# Altium schematic symbol library 724452_RPL-HX_Mobile_AEP_Rev0p91_Library.SchLib: 162 symbols (part 2 of 5) (continued)
## C_RPL_HX_EXT (continued)
part L pins: AU50 VSS_242, AU54 VSS_243, AV1 VSS_248, AV5 VSS_275, AV9 VSS_279, AV10 VSS_249, AV11 VSS_250, AV12 VSS_251, AV13 VSS_252, AV14 VSS_253, AV18 VSS_254, AV20 VSS_255, AV21 VSS_256, AV23 VSS_257, AV25 VSS_258, AV27 VSS_259, AV29 VSS_260, AV31 VSS_261, AV33 VSS_262, AV35 VSS_263, AV36 VSS_264, AV40 VSS_265, AV41 VSS_266, AV42 VSS_267, AV43 VSS_268, AV44 VSS_269, AV45 VSS_270, AV46 VSS_271, AV47 VSS_272, AV48 VSS_273, AV49 VSS_274, AV50 VSS_276, AV52 VSS_277, AV54 VSS_278, AW1 VSS_280, AW3 VSS_285, AW5 VSS_292, AW7 VSS_296, AW9 VSS_297, AW14 VSS_281, AW16 VSS_282, AW18 VSS_283, AW20 VSS_284, AW33 VSS_286, AW34 VSS_287, AW36 VSS_288, AW38 VSS_289, AW40 VSS_290, AW45 VSS_291, AW50 VSS_293, AW52 VSS_294, AW54 VSS_295, AY1 VSS_298, AY3 VSS_310, AY5 VSS_322, AY7 VSS_325, AY9 VSS_326, AY11 VSS_299, AY12 VSS_300, AY14 VSS_301, AY16 VSS_302, AY18 VSS_303, AY20 VSS_304, AY22 VSS_305, AY23 VSS_306, AY24 VSS_307, AY26 VSS_308, AY28 VSS_309, AY30 VSS_311, AY32 VSS_312, AY33 VSS_313, AY36 VSS_314, AY38 VSS_315, AY40 VSS_316, AY42 VSS_317, AY43 VSS_318, AY45 VSS_319, AY47 VSS_320, AY48 VSS_321, AY50 VSS_323, AY54 VSS_324, BA1 VSS_346, BA5 VSS_354, BA9 VSS_360, BA14 VSS_347, BA18 VSS_348, BA20 VSS_349, BA35 VSS_350, BA36 VSS_351, BA40 VSS_352, BA45 VSS_353, BA50 VSS_355, BA51 VSS_356, BA52 VSS_357, BA53 VSS_358, BA54 VSS_359, BB1 VSS_361, BB2 VSS_372, BB3 VSS_383, BB4 VSS_394, BB5 VSS_405, BB6 VSS_407, BB7 VSS_408, BB8 VSS_409, BB9 VSS_410, BB10 VSS_362, BB11 VSS_363, BB12 VSS_364, BB13 VSS_365, BB14 VSS_366, BB15 VSS_367, BB16 VSS_368, BB17 VSS_369, BB18 VSS_370, BB19 VSS_371, BB20 VSS_373, BB21 VSS_374, BB22 VSS_375, BB23 VSS_376, BB24 VSS_377
part M pins: AL46 VSS_122, AL48 VSS_123, AL50 VSS_124, AL51 VSS_125, AL52 VSS_126, AL53 VSS_127, AL54 VSS_128, AM1 VSS_133, AM2 VSS_134, AM3 VSS_135, AM4 VSS_136, AM5 VSS_139, AM6 VSS_142, AM7 VSS_143, AM8 VSS_144, AM9 VSS_145, AM46 VSS_137, AM48 VSS_138, AM50 VSS_140, AM54 VSS_141, AN1 VSS_146, AN5 VSS_152, AN9 VSS_156, AN11 VSS_147, AN25 VSS_148, AN28 VSS_149, AN41 VSS_150, AN46 VSS_151, AN50 VSS_153, AN52 VSS_154, AN54 VSS_155, AP1 VSS_157, AP3 VSS_160, AP5 VSS_167, AP7 VSS_171, AP9 VSS_172, AP25 VSS_158, AP28 VSS_159, AP41 VSS_161, AP45 VSS_162, AP46 VSS_163, AP47 VSS_164, AP48 VSS_165, AP49 VSS_166, AP50 VSS_168, AP52 VSS_169, AP54 VSS_170, AR1 VSS_173, AR3 VSS_185, AR5 VSS_196, AR7 VSS_199, AR9 VSS_200, AR11 VSS_174, AR13 VSS_175, AR15 VSS_176, AR17 VSS_177, AR22 VSS_178, AR23 VSS_179, AR24 VSS_180, AR25 VSS_181, AR26 VSS_182, AR28 VSS_183, AR29 VSS_184, AR30 VSS_186, AR31 VSS_187, AR32 VSS_188, AR33 VSS_189, AR34 VSS_190, AR36 VSS_191, AR38 VSS_192, AR41 VSS_193, AR43 VSS_194, AR45 VSS_195, AR50 VSS_197, AR54 VSS_198, AT1 VSS_201, AT5 VSS_214, AT9 VSS_220, AT18 VSS_202, AT19 VSS_203, AT20 VSS_204, AT21 VSS_205, AT24 VSS_206, AT32 VSS_207, AT35 VSS_208, AT36 VSS_209, AT41 VSS_210, AT45 VSS_211, AT47 VSS_212, AT48 VSS_213, AT50 VSS_215, AT51 VSS_216, AT52 VSS_217, AT53 VSS_218, AT54 VSS_219, AU1 VSS_221, AU2 VSS_227, AU3 VSS_231, AU4 VSS_239, AU5 VSS_241, AU6 VSS_244, AU7 VSS_245, AU8 VSS_246, AU9 VSS_247, AU14 VSS_222, AU15 VSS_223, AU16 VSS_224, AU17 VSS_225, AU18 VSS_226, AU21 VSS_228, AU23 VSS_229, AU26 VSS_230, AU30 VSS_232, AU33 VSS_233, AU35 VSS_234, AU36 VSS_235, AU37 VSS_236, AU38 VSS_237, AU39 VSS_238, AU45 VSS_240
part N pins: AA1 VSS_34, AA2 VSS_36, AA3 VSS_37, AA4 VSS_38, AA7 VSS_39, AA9 VSS_40, AA11 VSS_35, AB3 VSS_43, AB4 VSS_44, AB5 VSS_45, AB6 VSS_46, AB7 VSS_47, AB8 VSS_48, AB9 VSS_49, AB10 VSS_41, AB11 VSS_42, AC1 VSS_50, AC2 VSS_55, AC5 VSS_59, AC8 VSS_62, AC9 VSS_63, AC10 VSS_51, AC11 VSS_52, AC12 VSS_53, AC13 VSS_54, AC45 VSS_56, AC47 VSS_57, AC49 VSS_58, AC51 VSS_60, AC53 VSS_61, AD3 VSS_64, AD4 VSS_65, AD6 VSS_66, AD9 VSS_67, AE1 VSS_68, AE2 VSS_70, AE5 VSS_74, AE8 VSS_77, AE9 VSS_78, AE11 VSS_69, AE45 VSS_71, AE47 VSS_72, AE49 VSS_73, AE51 VSS_75, AE53 VSS_76, AF3 VSS_79, AF4 VSS_80, AF6 VSS_81, AF9 VSS_82, AG1 VSS_83, AG2 VSS_85, AG5 VSS_89, AG8 VSS_92, AG9 VSS_93, AG11 VSS_84, AG45 VSS_86, AG47 VSS_87, AG49 VSS_88, AG51 VSS_90, AG53 VSS_91, AH3 VSS_94, AH4 VSS_95, AH5 VSS_96, AH6 VSS_97, AH9 VSS_98, AJ1 VSS_99, AJ2 VSS_101, AJ5 VSS_108, AJ8 VSS_111, AJ9 VSS_112, AJ11 VSS_100, AJ44 VSS_102, AJ45 VSS_103, AJ46 VSS_104, AJ47 VSS_105, AJ48 VSS_106, AJ49 VSS_107, AJ50 VSS_109, AJ51 VSS_110, AK3 VSS_113, AK4 VSS_114, AK6 VSS_117, AK9 VSS_118, AK46 VSS_115, AK50 VSS_116, AL3 VSS_120, AL4 VSS_121, AL6 VSS_129, AL7 VSS_130, AL8 VSS_131, AL9 VSS_132, AL11 VSS_119, V6 VSS_803, V7 VSS_804, V9 VSS_805, V45 VSS_797, V47 VSS_798, V49 VSS_799, V51 VSS_801, V53 VSS_802, W1 VSS_806, W2 VSS_809, W3 VSS_810, W4 VSS_811, W7 VSS_812, W8 VSS_813, W9 VSS_814, W10 VSS_807, W11 VSS_808, Y1 VSS_815, Y4 VSS_817, Y5 VSS_821, Y6 VSS_824, Y7 VSS_825, Y9 VSS_826, Y11 VSS_816, Y45 VSS_818, Y47 VSS_819, Y49 VSS_820, Y51 VSS_822, Y53 VSS_823
part O pins: K12 VSS_672, K14 VSS_673, K19 VSS_674, K22 VSS_675, K25 VSS_676, K28 VSS_677, K34 VSS_678, K36 VSS_679, K39 VSS_681, K41 VSS_683, K43 VSS_684, K45 VSS_685, K47 VSS_686, K49 VSS_687, K51 VSS_689, K53 VSS_690, L1 VSS_693, L2 VSS_696, L3 VSS_699, L4 VSS_700, L7 VSS_701, L9 VSS_702, L18 VSS_694, L19 VSS_695, L25 VSS_697, L27 VSS_698, M1 VSS_703, M4 VSS_716, M5 VSS_722, M6 VSS_725, M7 VSS_726, M8 VSS_727, M9 VSS_728, M11 VSS_704, M17 VSS_705, M18 VSS_706, M22 VSS_707, M25 VSS_708, M27 VSS_709, M29 VSS_710, M31 VSS_711, M33 VSS_712, M35 VSS_713, M37 VSS_714, M39 VSS_715, M41 VSS_717, M43 VSS_718, M45 VSS_719, M47 VSS_720, M49 VSS_721, M51 VSS_723, M53 VSS_724, N1 VSS_729, N2 VSS_735, N3 VSS_738, N4 VSS_739, N7 VSS_740, N9 VSS_741, N13 VSS_730, N14 VSS_731, N15 VSS_732, N16 VSS_733, N17 VSS_734, N25 VSS_736, N27 VSS_737, P1 VSS_742, P4 VSS_756, P5 VSS_762, P6 VSS_765, P7 VSS_766, P8 VSS_767, P9 VSS_768, P12 VSS_743, P17 VSS_744, P18 VSS_745, P19 VSS_746, P22 VSS_747, P25 VSS_748, P27 VSS_749, P29 VSS_750, P31 VSS_751, P33 VSS_752, P35 VSS_753, P37 VSS_754, P39 VSS_755, P41 VSS_757, P43 VSS_758, P45 VSS_759, P47 VSS_760, P49 VSS_761, P51 VSS_763, P53 VSS_764, R1 VSS_769, R2 VSS_772, R3 VSS_774, R4 VSS_775, R7 VSS_776, R10 VSS_770, R11 VSS_771, R27 VSS_773, T1 VSS_777, T4 VSS_778, T5 VSS_782, T6 VSS_785, T7 VSS_786, T8 VSS_787, T9 VSS_788, T45 VSS_779, T47 VSS_780, T49 VSS_781, T51 VSS_783, T53 VSS_784, U1 VSS_789, U2 VSS_790, U3 VSS_791, U4 VSS_792, U7 VSS_793, U9 VSS_794, V1 VSS_795, V4 VSS_796, V5 VSS_800
part P pins: D43 VSS_550, D45 VSS_551, D47 VSS_552, D49 VSS_553, D51 VSS_555, D53 VSS_556, E1 VSS_561, E2 VSS_567, E3 VSS_573, E4 VSS_576, E5 VSS_578, E8 VSS_579, E10 VSS_562, E12 VSS_563, E14 VSS_564, E16 VSS_565, E18 VSS_566, E20 VSS_568, E22 VSS_569, E24 VSS_570, E26 VSS_571, E28 VSS_572, E30 VSS_574, E36 VSS_575, E42 VSS_577, F1 VSS_580, F4 VSS_598, F5 VSS_603, F6 VSS_606, F7 VSS_607, F8 VSS_608, F10 VSS_581, F12 VSS_582, F14 VSS_583, F16 VSS_584, F18 VSS_585, F20 VSS_586, F22 VSS_587, F24 VSS_588, F26 VSS_589, F28 VSS_590, F30 VSS_591, F31 VSS_592, F33 VSS_593, F35 VSS_594, F36 VSS_595, F37 VSS_596, F39 VSS_597, F41 VSS_599, F45 VSS_600, F47 VSS_601, F49 VSS_602, F51 VSS_604, F53 VSS_605, G1 VSS_609, G2 VSS_620, G3 VSS_631, G4 VSS_636, G7 VSS_638, G8 VSS_639, G9 VSS_640, G10 VSS_610, G11 VSS_611, G12 VSS_612, G13 VSS_613, G14 VSS_614, G15 VSS_615, G16 VSS_616, G17 VSS_617, G18 VSS_618, G19 VSS_619, G20 VSS_621, G21 VSS_622, G22 VSS_623, G23 VSS_624, G24 VSS_625, G25 VSS_626, G26 VSS_627, G27 VSS_628, G28 VSS_629, G29 VSS_630, G30 VSS_632, G34 VSS_633, G36 VSS_634, G38 VSS_635, G40 VSS_637, H1 VSS_641, H4 VSS_646, H5 VSS_652, H6 VSS_655, H7 VSS_656, H17 VSS_642, H19 VSS_643, H25 VSS_644, H28 VSS_645, H41 VSS_647, H43 VSS_648, H45 VSS_649, H47 VSS_650, H49 VSS_651, H51 VSS_653, H53 VSS_654, J1 VSS_657, J2 VSS_660, J3 VSS_662, J4 VSS_668, J7 VSS_669, J16 VSS_658, J19 VSS_659, J25 VSS_661, J30 VSS_663, J33 VSS_664, J35 VSS_665, J37 VSS_666, K1 VSS_670, K4 VSS_682, K5 VSS_688, K6 VSS_691, K7 VSS_692, K10 VSS_671
part Q pins: AA13 RSVD_2, AB13 RSVD_4, AB44 VCCGT_1, AB45 VCCGT_2, AB46 VCCGT_3, AB47 VCCGT_4, AB48 VCCGT_5, AB49 VCCGT_6, AB50 VCCGT_7, AB51 VCCGT_8, AB52 VCCGT_9, AB53 VCCGT_10, AB54 VCCGT_11, AK1 VCC1P8_PROC_1, AN26 VDD2_1, AN27 VDD2_2, AP26 VDD2_3, AP27 VDD2_4, AR27 VDD2_5, AR42 RSVD_TP_5, AU44 RSVD_21, C43 RSVD_24, H20 VCCIN_AUX_14, H21 VCCIN_AUX_15, H22 VCCIN_AUX_16, H23 VCCIN_AUX_17, H24 VCCIN_AUX_18, J20 VCCIN_AUX_19, J21 VCCIN_AUX_20, J22 VCCIN_AUX_21, J23 VCCIN_AUX_22, J24 VCCIN_AUX_23, J32 RSVD_36, K20 VCCIN_AUX_24, K21 VCCIN_AUX_25, K23 VCCIN_AUX_26, K24 VCCIN_AUX_27, K38 RSVD_TP_14, L20 VCCIN_AUX_28, L21 VCCIN_AUX_29, L22 VCCIN_AUX_30, L23 VCCIN_AUX_31, L24 VCCIN_AUX_32, M19 VCCIN_AUX_33, R13 RSVD_51, R14 RSVD_52, R15 RSVD_53, R16 RSVD_54, R17 RSVD_55, R18 RSVD_56, T13 RSVD_58, U13 RSVD_60, V13 RSVD_62, W13 RSVD_64, Y13 RSVD_66
part R pins: A44 VCCCORE_1, A45 VCCCORE_2, A46 VCCCORE_3, A47 VCCCORE_4, A48 VCCCORE_5, A49 VCCCORE_6, A50 VCCCORE_7, A51 VCCCORE_8, A52 VCCCORE_9, A53 VCCCORE_10, A54 VCCCORE_11, B44 VCCCORE_129, B46 VCCCORE_130, B48 VCCCORE_131, B50 VCCCORE_132, B52 VCCCORE_133, B53 VCCCORE_134, B54 VCCCORE_135, C44 VCCCORE_136, C45 VCCCORE_137, C46 VCCCORE_138, C47 VCCCORE_139, C48 VCCCORE_140, C49 VCCCORE_141, C50 VCCCORE_142, C51 VCCCORE_143, C52 VCCCORE_144, C53 VCCCORE_145, C54 VCCCORE_146, D44 VCCCORE_147, D46 VCCCORE_148, D48 VCCCORE_149, D50 VCCCORE_150, D52 VCCCORE_151, D54 VCCCORE_152, E43 VCCCORE_153, E44 VCCCORE_154, E45 VCCCORE_155, E46 VCCCORE_156, E47 VCCCORE_157, E48 VCCCORE_158, E49 VCCCORE_159, E50 VCCCORE_160, E51 VCCCORE_161, E52 VCCCORE_162, E53 VCCCORE_163, E54 VCCCORE_164, F42 VCCCORE_165, F43 VCCCORE_166, F44 VCCCORE_167, F46 VCCCORE_168, F48 VCCCORE_169, F50 VCCCORE_170, F52 VCCCORE_171, F54 VCCCORE_172, G41 VCCCORE_173, G42 VCCCORE_174, G43 VCCCORE_175, G44 VCCCORE_176, G45 VCCCORE_177, G46 VCCCORE_178, G47 VCCCORE_179, G48 VCCCORE_180, G49 VCCCORE_181, G50 VCCCORE_182, G51 VCCCORE_183, G52 VCCCORE_184, G53 VCCCORE_185, G54 VCCCORE_186, H40 VCCCORE_187, H42 VCCCORE_188, H44 VCCCORE_189, H46 VCCCORE_190, H48 VCCCORE_191, H50 VCCCORE_192, H52 VCCCORE_193, H54 VCCCORE_194, J39 VCCCORE_195, J40 VCCCORE_196, J41 VCCCORE_197, J42 VCCCORE_198, J43 VCCCORE_199, J44 VCCCORE_200, J45 VCCCORE_201, J46 VCCCORE_202, J47 VCCCORE_203, J48 VCCCORE_204, J49 VCCCORE_205, J50 VCCCORE_206, J51 VCCCORE_207
part S pins: A3 VSS_21, A4 VSS_28, A5 VSS_31, A8 VSS_32, A9 VSS_33, A10 VSS_1, A11 VSS_2, A12 VSS_3, A13 VSS_4, A14 VSS_5, A15 VSS_6, A16 VSS_7, A17 VSS_8, A18 VSS_9, A19 VSS_10, A20 VSS_11, A21 VSS_12, A22 VSS_13, A23 VSS_14, A24 VSS_15, A25 VSS_16, A26 VSS_17, A27 VSS_18, A28 VSS_19, A29 VSS_20, A30 VSS_22, A32 VSS_23, A34 VSS_24, A35 VSS_25, A36 VSS_26, A38 VSS_27, A40 VSS_29, A42 VSS_30, B2 VSS_332, B3 VSS_338, B7 VSS_344, B9 VSS_345, B11 VSS_327, B13 VSS_328, B15 VSS_329, B17 VSS_330, B19 VSS_331, B21 VSS_333, B23 VSS_334, B25 VSS_335, B27 VSS_336, B29 VSS_337, B35 VSS_339, B45 VSS_340, B47 VSS_341, B49 VSS_342, B51 VSS_343, C1 VSS_503, C2 VSS_509, C3 VSS_515, C7 VSS_521, C9 VSS_522, C11 VSS_504, C13 VSS_505, C15 VSS_506, C17 VSS_507, C19 VSS_508, C21 VSS_510, C23 VSS_511, C25 VSS_512, C27 VSS_513, C29 VSS_514, C31 VSS_516, C33 VSS_517, C35 VSS_518, C37 VSS_519, C39 VSS_520, D1 VSS_523, D4 VSS_548, D5 VSS_554, D6 VSS_557, D7 VSS_558, D8 VSS_559, D9 VSS_560, D10 VSS_524, D11 VSS_525, D12 VSS_526, D13 VSS_527, D14 VSS_528, D15 VSS_529, D16 VSS_530, D17 VSS_531, D18 VSS_532, D19 VSS_533, D20 VSS_534, D21 VSS_535, D22 VSS_536, D23 VSS_537, D24 VSS_538, D25 VSS_539, D26 VSS_540, D27 VSS_541, D28 VSS_542, D29 VSS_543, D32 VSS_544, D34 VSS_545, D36 VSS_546, D38 VSS_547, D40 VSS_549
part A text: 1 OF 19
part B text: 2 OF 19
part C text: 3 OF 19
part D text: 4 OF 19
part E text: 5 OF 19
part F text: 6 OF 19
part G text: 7 OF 19
part H text: 8 OF 19
part I text: 9 OF 19
part J text: 10 OF 19
part K text: 11 OF 19
part L text: 12 OF 19
part M text: 13 OF 19
part N text: 14 OF 19
part O text: 15 OF 19
part P text: 16 OF 19
part Q text: 17 OF 19
part R text: 18 OF 19
part S text: 19 OF 19

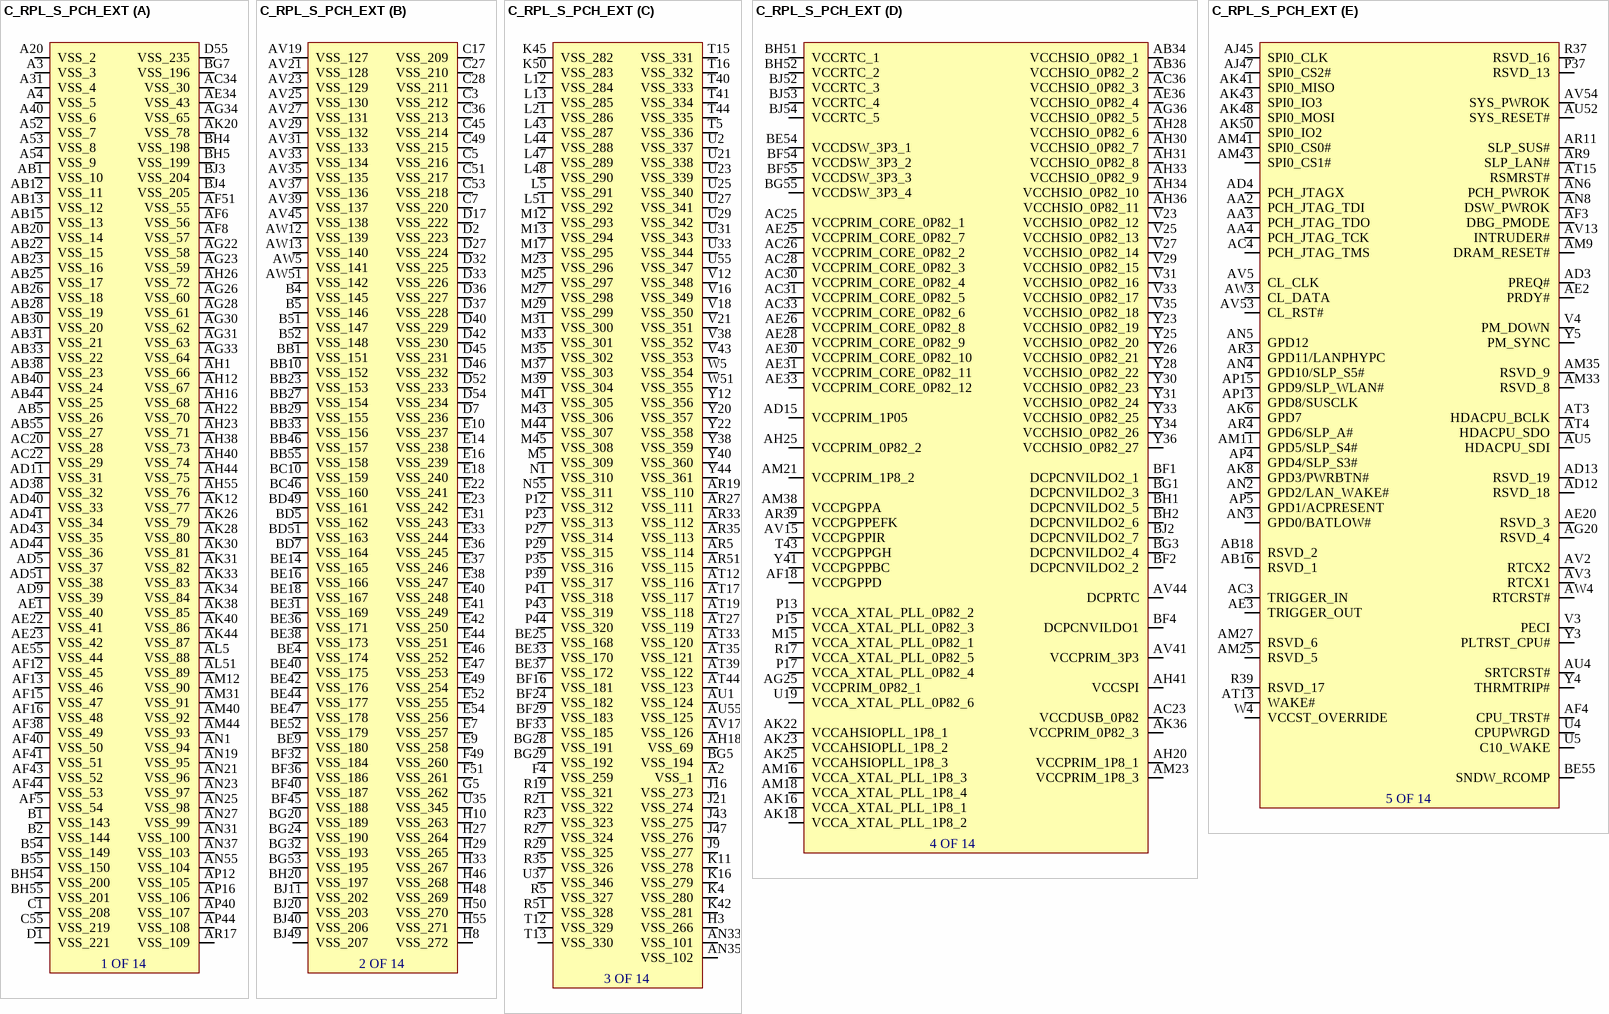
[diagram p20: symbol C_RPL_S_PCH_EXT]

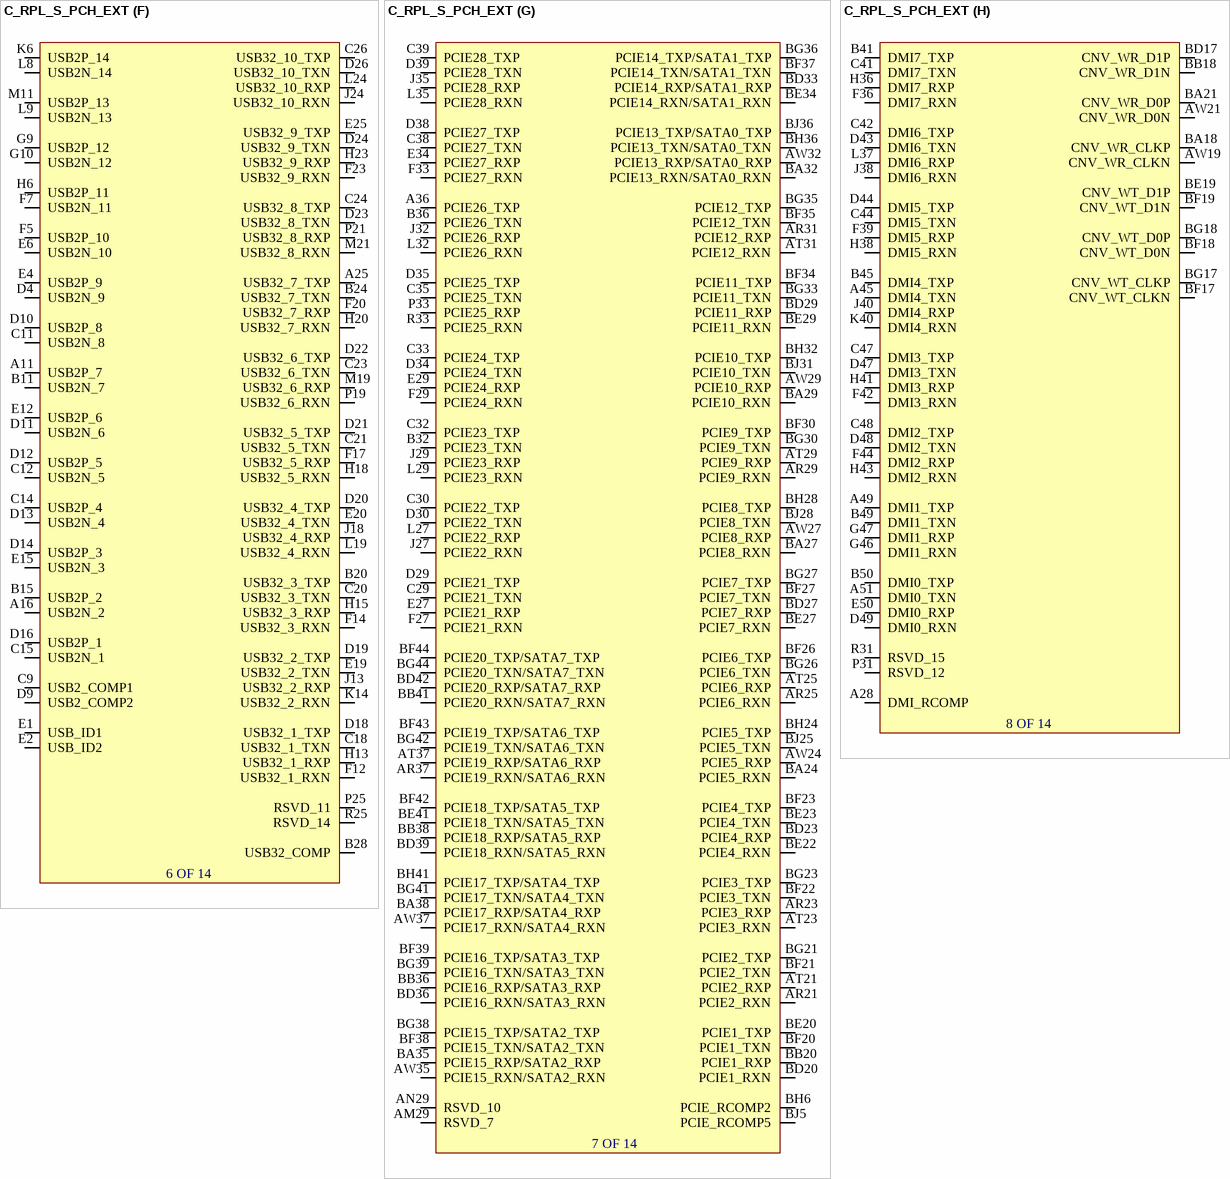
[diagram p21: symbol C_RPL_S_PCH_EXT]

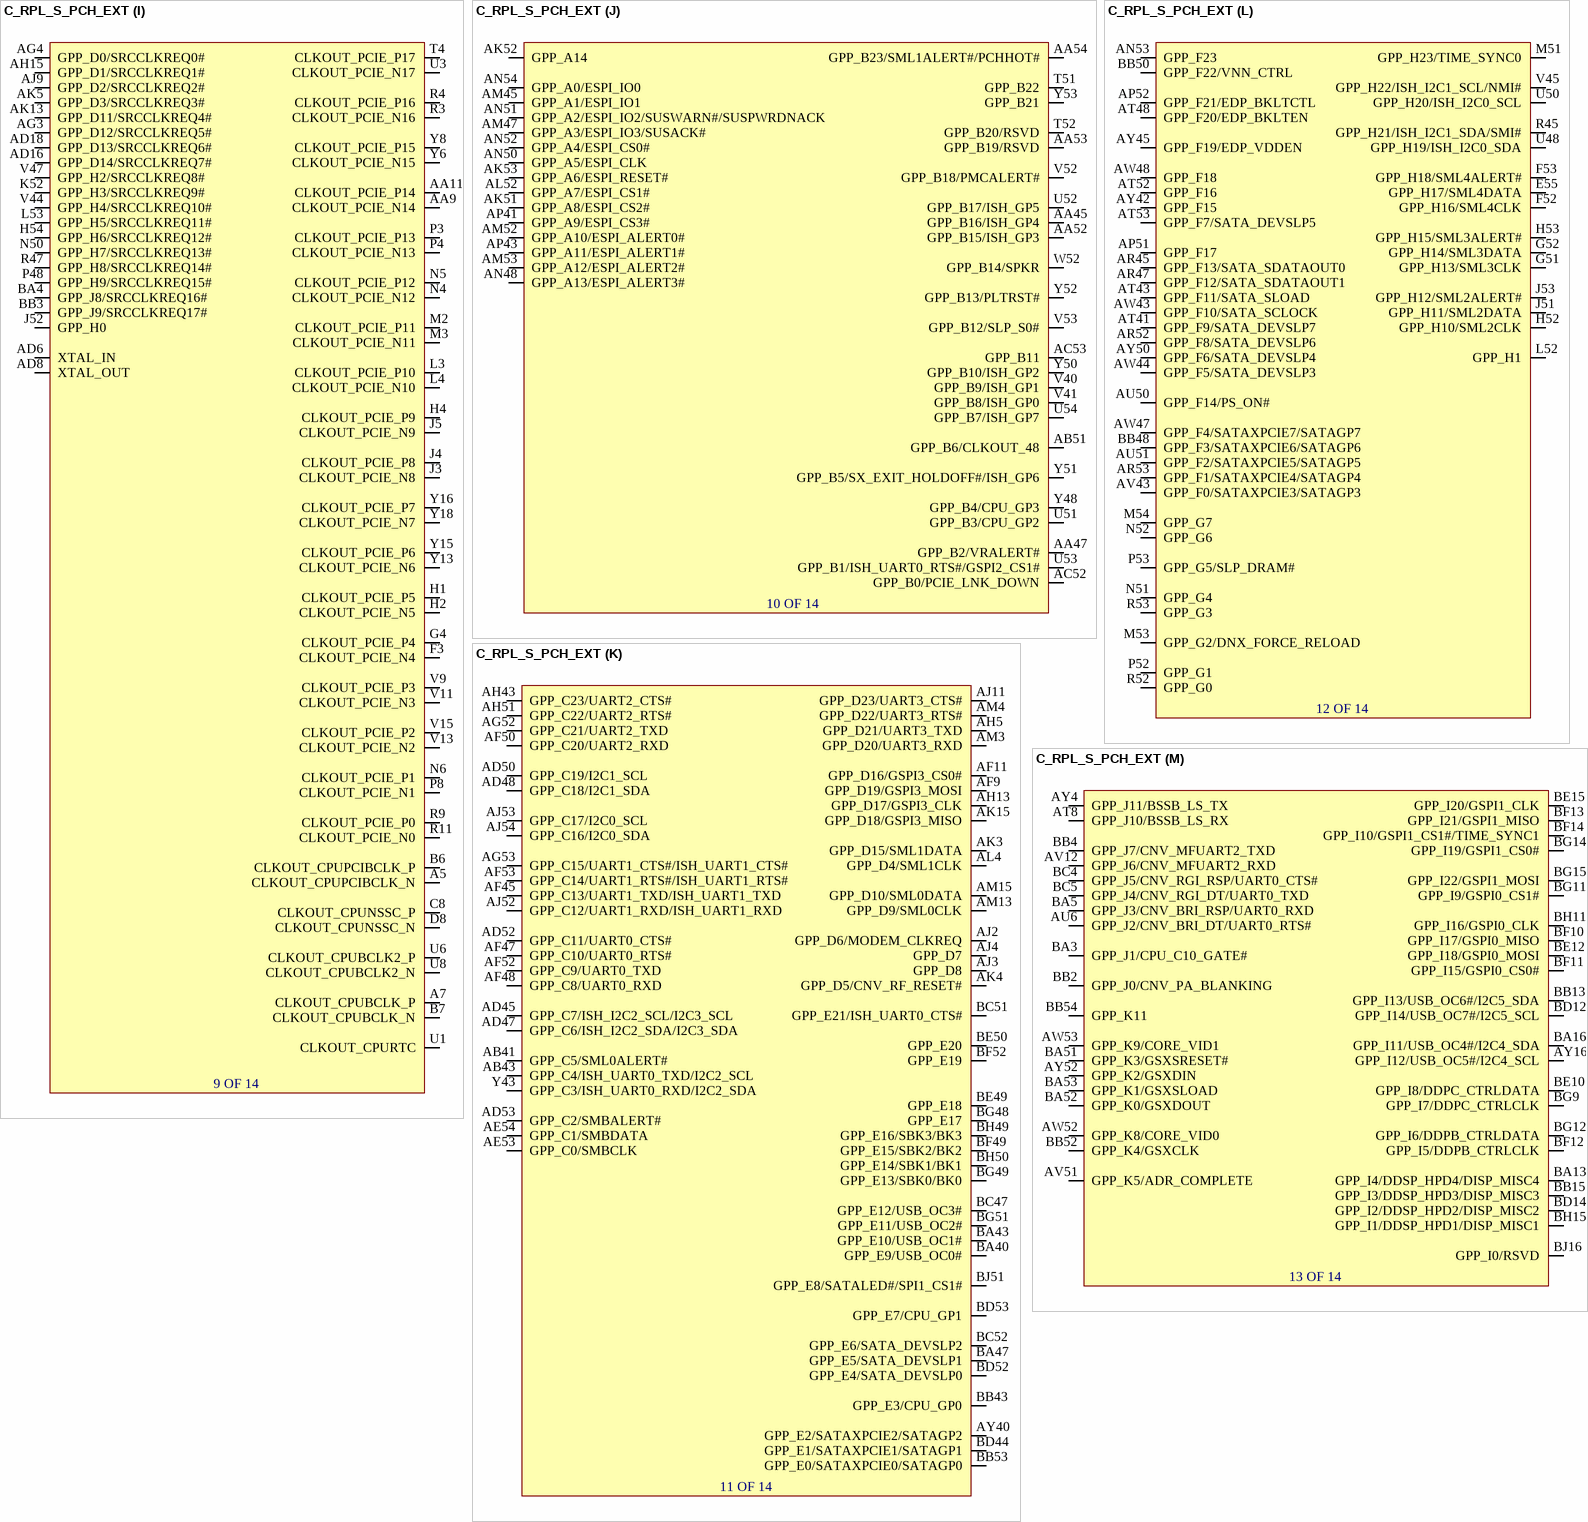
[diagram p22: symbol C_RPL_S_PCH_EXT]

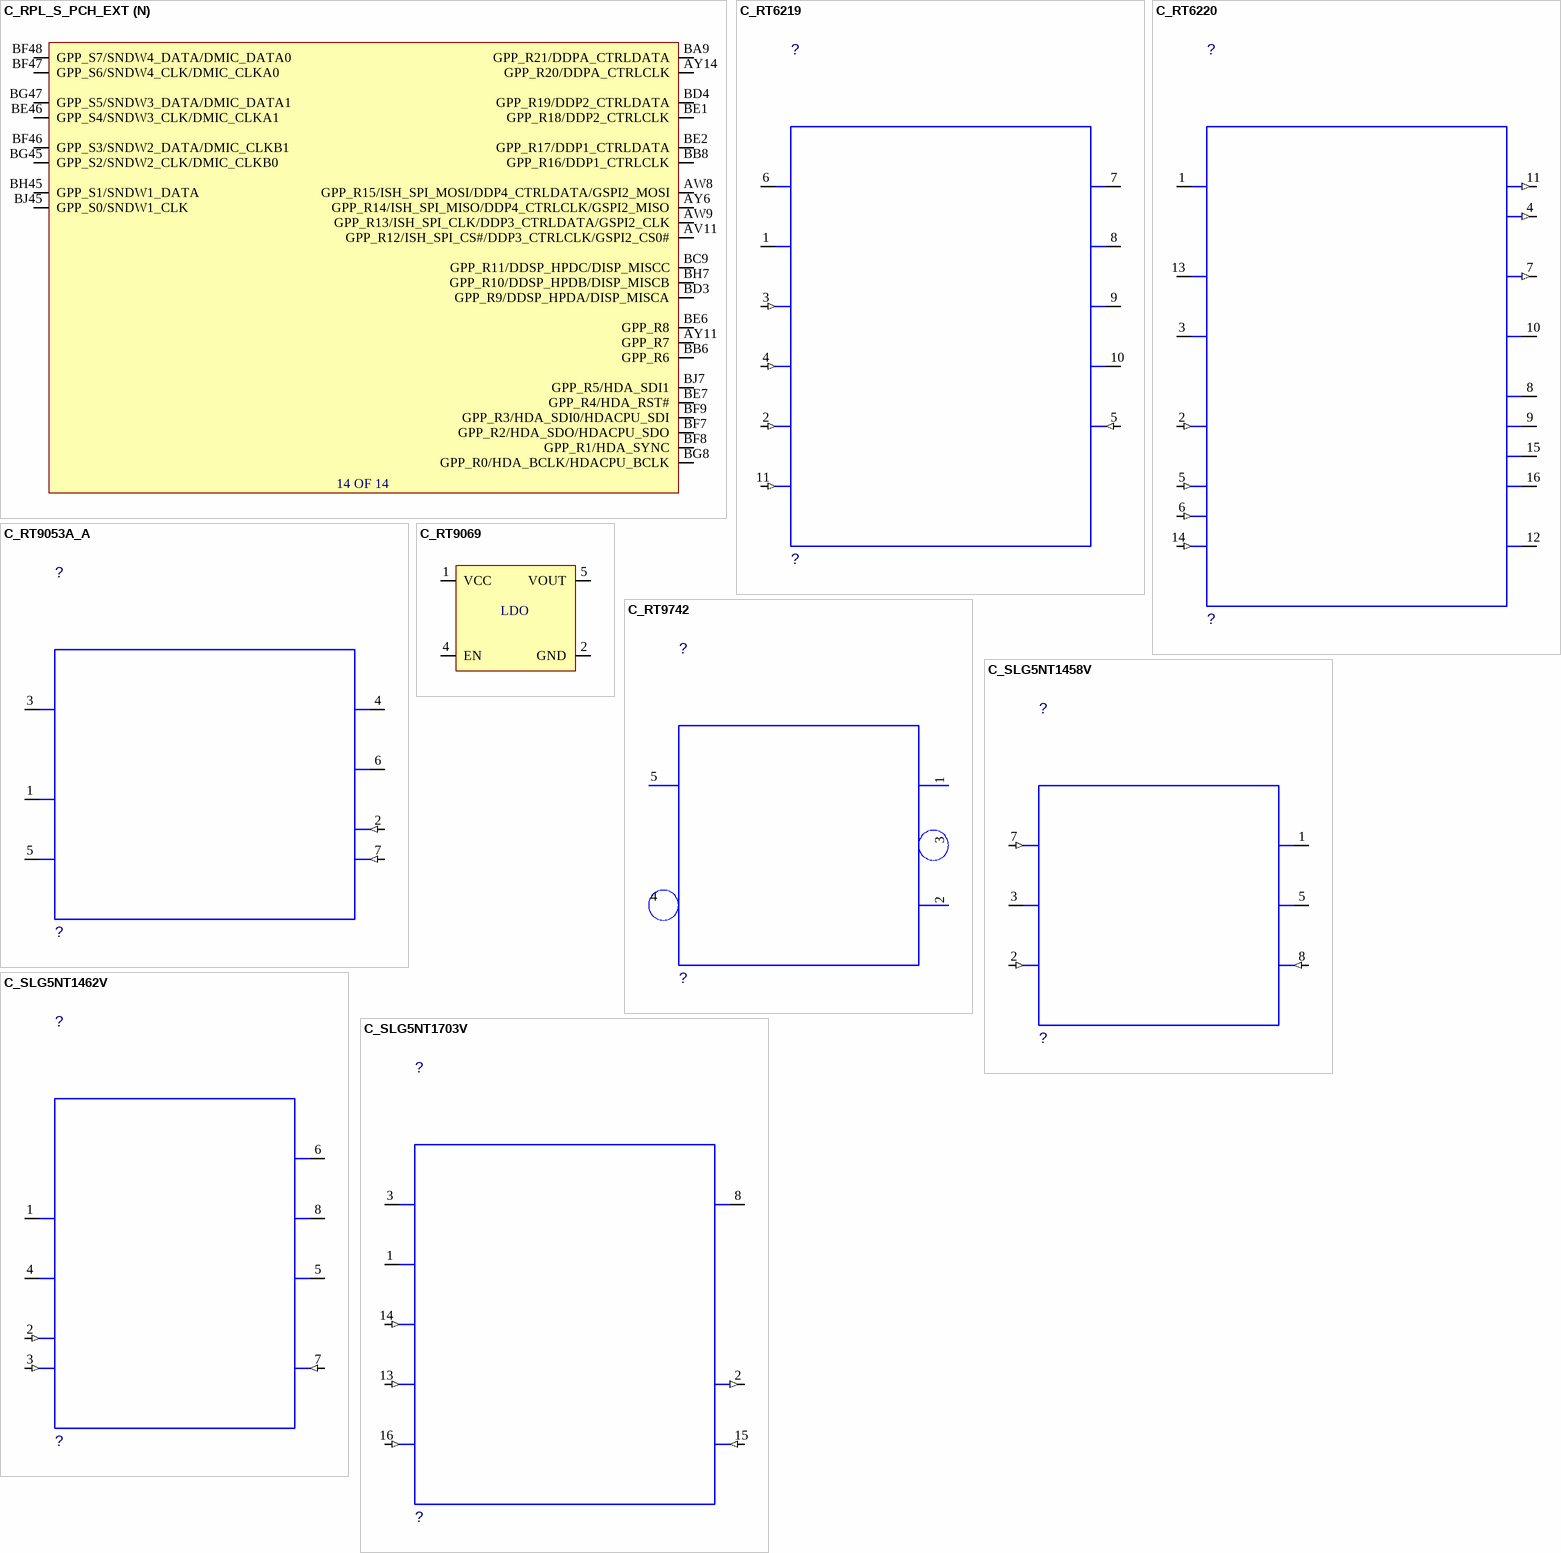
[diagram p23: symbols C_RPL_S_PCH_EXT to C_SLG5NT1703V]